# Altium footprint library PBL - SMD Packages.PcbLib: 263 footprints (part 4 of 17)
Each footprint in its own frame and in the unit in brackets; x right, y up, seen from the top. Pads: shape width x height; smd on the part's side, far side on the other; paste and mask are expansions set on the pad; w line width, h text height; cw(c..) or ccw(c..) is an arc to the next point about the centre after c.
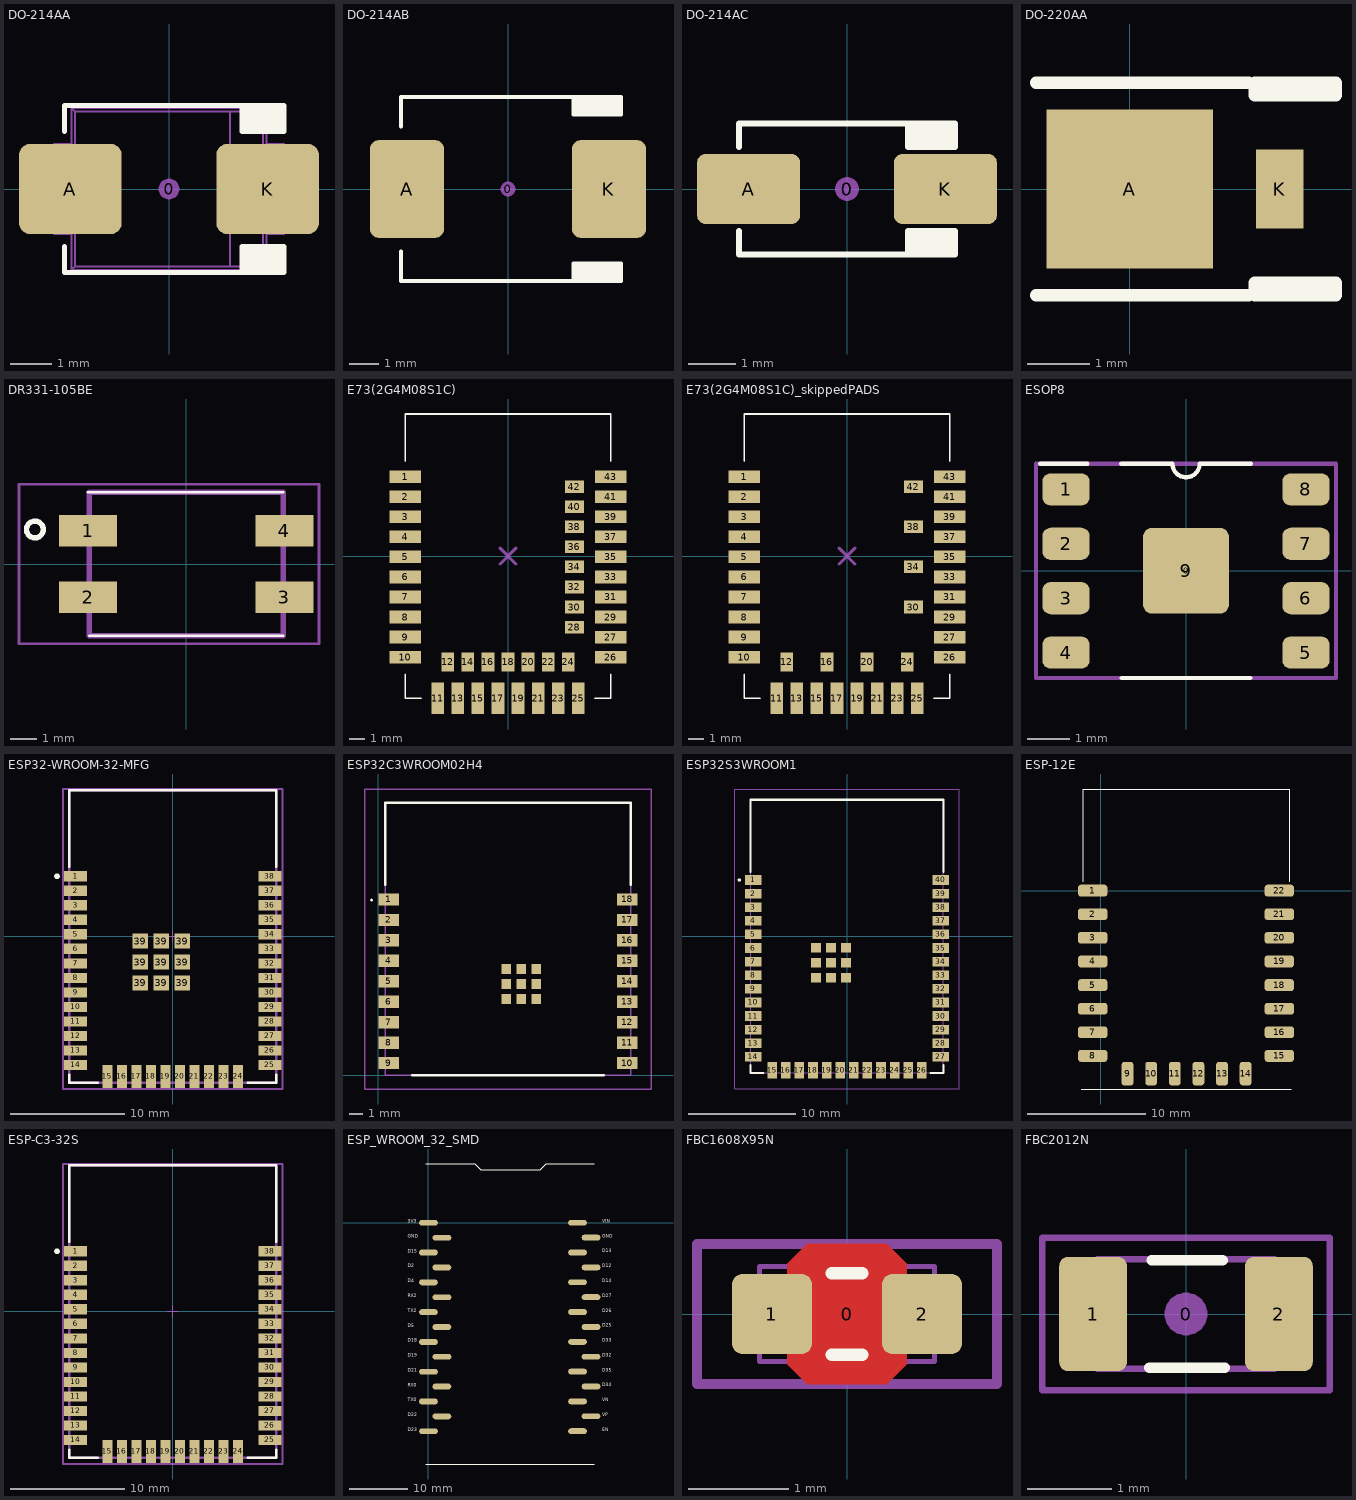
[diagram p3: the footprints below, top view; thin cyan lines are the x and y axes]

## DO-214AA [mm] "JEDEC DO214 variation AA. SMB"
height 2.65
pads (3):
  round 0.508 on Mech15: 0(0,0)
  rrect25% 2.5x2.2 smd: A(-2.4,0) K(2.4,0)
Top Overlay:
  region: 1.778,-1.397 1.778,-2.032 2.794,-2.032 2.794,-1.397
  region: 1.778,1.397 1.778,2.032 2.794,2.032 2.794,1.397
  lines w0.127: -2.54,-1.397 -2.54,-2.032 1.778,-2.032 ; -2.54,1.397 -2.54,2.032 1.778,2.032 ; 1.778,-2.032 2.794,-2.032 2.794,-1.397 1.778,-1.397 1.778,-2.032 ; 1.778,2.032 1.778,1.397 2.794,1.397 2.794,2.032 1.778,2.032
13 - 3D Top Side:
  lines w0.05: -2.375,-1.1 -2.375,-1.973 ; -2.375,1.1 -2.375,1.973 ; 2.375,-1.1 2.375,-1.973 ; 2.375,1.1 2.375,1.973 ; -2.375,-1.973 -2.285,-1.883 ; -2.375,-1.973 -2.373,-1.975 2.373,-1.975 2.375,-1.973 ; -2.375,1.973 -2.285,1.883 ; -2.375,1.973 -2.373,1.975 2.373,1.975 2.375,1.973 ; -2.285,-1.883 -2.285,1.883 ; -2.285,-1.883 1.485,-1.884 ; -2.285,1.883 1.485,1.884 ; 1.485,-1.884 1.485,1.884 ; 1.485,-1.884 2.285,-1.884 ; 1.485,1.884 2.285,1.884 ; 2.285,-1.884 2.375,-1.973 ; 2.285,-1.884 2.285,1.884 ; 2.285,1.884 2.375,1.973 ; -2.8,-1.1 -2.8,1.1 -2.356,1.1 -2.356,-1.1 -2.8,-1.1 ; 2.356,-1.1 2.356,1.1 2.8,1.1 2.8,-1.1 2.356,-1.1
3D body "DO-214AA.STEP": height 2.62, standoff 0, extent -2.8,-1.975 2.8,1.975

## DO-214AB [mm] "JEDEC DO214 variation AB. SMC"
height 2.5
pads (3):
  round 0.508 on Mech15: 0(0,0)
  rrect25% 2.5x3.3 smd: A(-3.4,0) K(3.4,0)
Top Overlay:
  rectangle: 2.2,2.5 3.8,3.1
  rectangle: 2.2,-3.1 3.8,-2.5
  lines w0.127: -3.6,-2.1 -3.6,-3.1 3.8,-3.1 3.8,-2.5 2.2,-2.5 2.2,-3.1 ; -3.6,2.1 -3.6,3.1 3.8,3.1 3.8,2.5 2.2,2.5 2.2,3.1
3D body: height 2.62, standoff 0.01, extent -3.975,-2.975 4.05,2.975

## DO-214AC [mm] "JEDEC DO214 variation AC. SMA"
height 2.5
pads (3):
  round 0.508 on Mech15: 0(0,0)
  rrect25% 2.2x1.5 smd: A(-2.1,0) K(2.1,0)
Top Overlay:
  rectangle: 1.3,-1.4 2.3,-0.9
  rectangle: 1.3,0.9 2.3,1.4
  lines w0.127: -2.3,-0.9 -2.3,-1.4 2.3,-1.4 2.3,-0.9 1.3,-0.9 1.3,-1.4 ; -2.3,0.9 -2.3,1.4 2.3,1.4 2.3,0.9 1.3,0.9 ; 1.3,0.911 1.3,1.4
3D body "SW3dPS-DO-214AC SMA.STEP": height 2.42, standoff 0.02, extent -2.6,-1.3 2.6,1.3

## DO-220AA [mm]
pads (2):
  rect 2.67x2.54 smd mask+0.102: A(0,0)
  rect 0.762x1.27 smd mask+0.102: K(2.4,0)
Top Overlay:
  lines w0.2: -1.5,-1.7 1.9,-1.7 ; -1.5,1.7 1.9,1.7 ; 2,1.5 3.3,1.5 ; 2,1.5 2,1.7 3.3,1.7 3.3,1.5 ; 2,1.5 3.3,1.5 ; 2,-1.7 2,-1.5 3.3,-1.5 3.3,-1.7 3.1,-1.7 2,-1.7
3D body "User Library-DO-220AA.STEP": height 1.15, standoff 0, extent -1.256,-1.17 2.673,1.137

## DR331-105BE [mm] "Footprint for common mode choke DR331-105BE"
pads (4):
  rect 2.2x1.2 smd: 1(-3.7,1.25) 2(-3.7,-1.25) 3(3.7,-1.25) 4(3.7,1.25)
Top Overlay:
  circle w0.2: c-5.7,1.3 r0.316
  lines w0.1: -3.7,2.7 3.65,2.7 -3.7,2.7 ; -3.65,-2.7 3.65,-2.7 -3.65,-2.7
13 - 3D Top Side:
  lines w0.2: -3.65,-2.7 -3.65,2.7 3.65,2.7 3.65,-2.7 -3.65,-2.7
15 - Top Courtyards:
  lines w0.1: -6.3,-3 -6.3,3 5,3 5,-3 -6.3,-3
3D body "DR331-105BE.stp": height 5.4, standoff 0, extent -4.68,-2.7 4.68,2.7

## E73(2G4M08S1C) [mm]
pads (43):
  rect 2x0.8 smd: 1(-6.5,5.03) 2(-6.5,3.76) 3(-6.5,2.49) 4(-6.5,1.22) 5(-6.5,-0.05) 6(-6.5,-1.32) 7(-6.5,-2.59) 8(-6.5,-3.86) 9(-6.5,-5.127) 10(-6.5,-6.4) 26(6.5,-6.4) 27(6.5,-5.13) 29(6.5,-3.86) 31(6.5,-2.59) 33(6.5,-1.32) 35(6.5,-0.05) 37(6.5,1.22) 39(6.5,2.49) 41(6.5,3.757) 43(6.5,5.03)
  rect 0.8x2 smd: 11(-4.445,-9) 13(-3.175,-9) 15(-1.905,-9) 17(-0.635,-9) 19(0.635,-9) 21(1.905,-9) 23(3.175,-9) 25(4.445,-9)
  rect 0.8x1.2 smd: 12(-3.81,-6.7) 14(-2.54,-6.7) 16(-1.27,-6.7) 18(0,-6.7) 20(1.27,-6.7) 22(2.54,-6.7) 24(3.81,-6.7)
  rect 1.2x0.8 smd: 28(4.2,-4.495) 30(4.2,-3.225) 32(4.2,-1.955) 34(4.2,-0.685) 36(4.2,0.585) 38(4.2,1.855) 40(4.2,3.125) 42(4.2,4.39)
Top Overlay:
  lines w0.1: -6.5,-7.5 -6.5,-9 -5.5,-9 ; -6.5,6 -6.5,9 6.5,9 6.5,6 ; 5.5,-9 6.5,-9 6.5,-7.5
Top Component Center:
  lines w0.2: -0.5,-0.5 0.5,0.5 ; -0.5,0.5 0.5,-0.5

## E73(2G4M08S1C)_skippedPADS [mm]
pads (36):
  rect 2x0.8 smd: 1(-6.5,5.03) 2(-6.5,3.76) 3(-6.5,2.49) 4(-6.5,1.22) 5(-6.5,-0.05) 6(-6.5,-1.32) 7(-6.5,-2.59) 8(-6.5,-3.86) 9(-6.5,-5.127) 10(-6.5,-6.4) 26(6.5,-6.4) 27(6.5,-5.13) 29(6.5,-3.86) 31(6.5,-2.59) 33(6.5,-1.32) 35(6.5,-0.05) 37(6.5,1.22) 39(6.5,2.49) 41(6.5,3.757) 43(6.5,5.03)
  rect 0.8x2 smd: 11(-4.445,-9) 13(-3.175,-9) 15(-1.905,-9) 17(-0.635,-9) 19(0.635,-9) 21(1.905,-9) 23(3.175,-9) 25(4.445,-9)
  rect 0.8x1.2 smd: 12(-3.81,-6.7) 16(-1.27,-6.7) 20(1.27,-6.7) 24(3.81,-6.7)
  rect 1.2x0.8 smd: 30(4.2,-3.225) 34(4.2,-0.685) 38(4.2,1.855) 42(4.2,4.39)
Top Overlay:
  lines w0.1: -6.5,-7.5 -6.5,-9 -5.5,-9 ; -6.5,6 -6.5,9 6.5,9 6.5,6 ; 5.5,-9 6.5,-9 6.5,-7.5
Top Component Center:
  lines w0.2: -0.5,-0.5 0.5,0.5 ; -0.5,0.5 0.5,-0.5

## ESOP8 [mm] "SOP8 with exposed pad"
pads (10):
  round 0.254 on Mech15: 0(0,0)
  rrect50% 1.1x0.75 smd: 1(-2.8,1.9) 2(-2.8,0.63) 3(-2.8,-0.64) 4(-2.8,-1.91) 5(2.8,-1.91) 6(2.8,-0.64) 7(2.8,0.63) 8(2.8,1.9)
  rrect20% 2x2 smd mask+0.05: 9(0,0)
Top Overlay:
  lines w0.1: -3.4,2.5 -2.3,2.5 ; -1.514,2.498 -0.316,2.498 ccw(c0.001,2.498) 0.319,2.498 1.516,2.498 ; -1.5,-2.5 1.5,-2.5
Top Courtyard:
  lines w0.1: -3.5,-2.5 3.5,-2.5 3.5,2.5 -3.5,2.5 -3.5,-2.5

## ESP32-WROOM-32-MFG [mm]
pads (47):
  rect 2x0.9 smd paste+0 mask+0: 1(-8.5,5.26) 2(-8.5,3.99) 3(-8.5,2.72) 4(-8.5,1.45) 5(-8.5,0.18) 6(-8.5,-1.09) 7(-8.5,-2.36) 8(-8.5,-3.63) 9(-8.5,-4.9) 10(-8.5,-6.17) 11(-8.5,-7.44) 12(-8.5,-8.71) 13(-8.5,-9.98) 14(-8.5,-11.25) 25(8.5,-11.25) 26(8.5,-9.98) 27(8.5,-8.71) 28(8.5,-7.44) 29(8.5,-6.17) 30(8.5,-4.9) 31(8.5,-3.63) 32(8.5,-2.36) 33(8.5,-1.09) 34(8.5,0.18) 35(8.5,1.45) 36(8.5,2.72) 37(8.5,3.99) 38(8.5,5.26)
  rect 0.9x2 smd paste+0 mask+0: 15(-5.715,-12.25) 16(-4.445,-12.25) 17(-3.175,-12.25) 18(-1.905,-12.25) 19(-0.635,-12.25) 20(0.635,-12.25) 21(1.905,-12.25) 22(3.175,-12.25) 23(4.445,-12.25) 24(5.715,-12.25)
  rect 1.33x1.33 smd paste+0 mask+0: 39(-2.835,-4.075) 39(-2.835,-2.24) 39(-2.835,-0.405) 39(-1,-4.075) 39(-1,-2.24) 39(-1,-0.405) 39(0.835,-4.075) 39(0.835,-2.24) 39(0.835,-0.405)
Top Overlay:
  circle w0.25: c-10.125,5.26 r0.125
  lines w0.2: -9.05,-12.075 -9.05,-12.8 -6.54,-12.8 ; -9.05,6.085 -9.05,12.8 9.05,12.8 9.05,6.085 ; 6.54,-12.8 9.05,-12.8 9.05,-12.075
Top Assembly:
  lines w0.2: -9.6,-13.35 9.6,-13.35 9.6,12.9 -9.6,12.9 -9.6,-13.35
  text ".Designator" at 0,-0.037 h1
Top 3D Body:
  lines w0.2: -9.05,-12.8 9.05,-12.8 9.05,12.8 -9.05,12.8 -9.05,-12.8
Top Courtyard:
  lines w0.2: -9.6,-13.35 9.6,-13.35 9.6,12.9 -9.6,12.9 -9.6,-13.35
Top Component Center:
  lines w0.1: -0.5,0 0.5,0 ; 0,-0.5 0,0.5
3D body "UNK_Espressif_Systems_ESP32-WROOM-32_eec.STEP": height 0.25, standoff 0, extent -9.6,-13.35 9.6,12.9

## ESP32C3WROOM02H4 [mm]
pads (27):
  rect 1.5x0.9 smd: 1(0.75,12.9) 2(0.75,11.4) 3(0.75,9.9) 4(0.75,8.4) 5(0.75,6.9) 6(0.75,5.4) 7(0.75,3.9) 8(0.75,2.4) 9(0.75,0.9) 10(18.25,0.9) 11(18.25,2.4) 12(18.25,3.9) 13(18.25,5.4) 14(18.25,6.9) 15(18.25,8.4) 16(18.25,9.9) 17(18.25,11.4) 18(18.25,12.9)
  rect 0.7x0.7 smd: PAD(9.36,5.6) PAD(9.36,6.7) PAD(9.36,7.8) PAD(10.46,5.6) PAD(10.46,6.7) PAD(10.46,7.8) PAD(11.56,5.6) PAD(11.56,6.7) PAD(11.56,7.8)
Top Overlay:
  lines w0.1: -0.5,12.8 cw(c-0.5,12.85) -0.5,12.9 cw(c-0.5,12.85) -0.5,12.8
  lines w0.2: 0.5,14 0.5,20 18.5,20 18.5,14 ; 2.5,0 16.5,0
13 - 3D Top Side:
  lines w0.1: 0.5,0 0.5,20 18.5,20 18.5,0 0.5,0
15 - Top Courtyards:
  lines w0.1: -1,-1 -1,21 20,21 20,-1 -1,-1
3D body "ESP32-C3-WROOM-02-H4.stp": height 3.45, standoff 0, extent 0.09,0 18.5,20

## ESP32S3WROOM1 [mm]
pads (49):
  rect 1.5x0.9 smd: 1(-8.75,5.26) 2(-8.75,3.99) 3(-8.75,2.72) 4(-8.75,1.45) 5(-8.75,0.18) 6(-8.75,-1.09) 7(-8.75,-2.36) 8(-8.75,-3.63) 9(-8.75,-4.9) 10(-8.75,-6.17) 11(-8.75,-7.44) 12(-8.75,-8.71) 13(-8.75,-9.98) 14(-8.75,-11.25) 27(8.75,-11.25) 28(8.75,-9.98) 29(8.75,-8.71) 30(8.75,-7.44) 31(8.75,-6.17) 32(8.75,-4.9) 33(8.75,-3.63) 34(8.75,-2.36) 35(8.75,-1.09) 36(8.75,0.18) 37(8.75,1.45) 38(8.75,2.72) 39(8.75,3.99) 40(8.75,5.26)
  rect 0.9x1.5 smd: 15(-6.985,-12.5) 16(-5.715,-12.5) 17(-4.445,-12.5) 18(-3.175,-12.5) 19(-1.905,-12.5) 20(-0.635,-12.5) 21(0.635,-12.5) 22(1.905,-12.5) 23(3.175,-12.5) 24(4.445,-12.5) 25(5.715,-12.5) 26(6.985,-12.5)
  rect 0.9x0.9 smd: PAD(-2.9,-3.86) PAD(-2.9,-2.46) PAD(-2.9,-1.06) PAD(-1.5,-3.86) PAD(-1.5,-2.46) PAD(-1.5,-1.06) PAD(-0.1,-3.86) PAD(-0.1,-2.46) PAD(-0.1,-1.06)
Top Overlay:
  lines w0.2: -9,-12 -9,-12.75 -7.8,-12.75 ; -9,6 -9,12.75 9,12.75 9,6 ; 7.8,-12.75 9,-12.75 9,-12 ; -10.1,5.26 ccw(c-10.05,5.26) -10,5.26 ; -10.1,5.26 cw(c-10.05,5.26) -10,5.26 ; -10.1,5.26 ccw(c-10.05,5.26) -10,5.26
13 - 3D Top Side:
  lines w0.1: -9,-12.75 -9,12.75 9,12.75 9,-12.75 -9,-12.75
15 - Top Courtyards:
  lines w0.1: -10.5,-14.25 -10.5,13.75 10.5,13.75 10.5,-14.25 -10.5,-14.25
3D body "UNK_Espressif_Systems_ESP32-WROOM-32_eec.STEP": height 0.25, standoff 0, extent -9.6,-13.35 9.6,12.9

## ESP-12E [mm]
pads (22):
  rrect50% 2.5x1 smd: 1(-0.7,0) 2(-0.7,-2) 3(-0.7,-4) 4(-0.7,-6) 5(-0.7,-8) 6(-0.7,-10) 7(-0.7,-12) 8(-0.7,-14) 15(15.1,-14) 16(15.1,-12) 17(15.1,-10) 18(15.1,-8) 19(15.1,-6) 20(15.1,-4) 21(15.1,-2) 22(15.1,0)
  rrect50% 1x2 smd: 9(2.25,-15.5) 10(4.25,-15.5) 11(6.25,-15.5) 12(8.25,-15.5) 13(10.25,-15.5) 14(12.25,-15.5)
Top Overlay:
  lines w0.1: -1.65,-16.8 16.1,-16.8 ; -1.5,0.75 -1.5,8.6 16,8.6 16,0.75
3D body "User Library-EPS8266 ESP-12E-1.STEP": height 2.65, standoff -0.04, extent -0.855,-15.505 15.155,8.5

## ESP-C3-32S [mm] "ESP-S3-32S footprint for AI-Thinker Module"
pads (38):
  rect 2x0.9 smd paste+0 mask+0: 1(-8.5,5.26) 2(-8.5,3.99) 3(-8.5,2.72) 4(-8.5,1.45) 5(-8.5,0.18) 6(-8.5,-1.09) 7(-8.5,-2.36) 8(-8.5,-3.63) 9(-8.5,-4.9) 10(-8.5,-6.17) 11(-8.5,-7.44) 12(-8.5,-8.71) 13(-8.5,-9.98) 14(-8.5,-11.25) 25(8.5,-11.25) 26(8.5,-9.98) 27(8.5,-8.71) 28(8.5,-7.44) 29(8.5,-6.17) 30(8.5,-4.9) 31(8.5,-3.63) 32(8.5,-2.36) 33(8.5,-1.09) 34(8.5,0.18) 35(8.5,1.45) 36(8.5,2.72) 37(8.5,3.99) 38(8.5,5.26)
  rect 0.9x2 smd paste+0 mask+0: 15(-5.715,-12.25) 16(-4.445,-12.25) 17(-3.175,-12.25) 18(-1.905,-12.25) 19(-0.635,-12.25) 20(0.635,-12.25) 21(1.905,-12.25) 22(3.175,-12.25) 23(4.445,-12.25) 24(5.715,-12.25)
Top Overlay:
  circle w0.25: c-10.125,5.26 r0.125
  lines w0.2: -9.05,-12.075 -9.05,-12.8 -6.54,-12.8 ; -9.05,6.085 -9.05,12.8 9.05,12.8 9.05,6.085 ; 6.54,-12.8 9.05,-12.8 9.05,-12.075
Top Assembly:
  lines w0.2: -9.6,-13.35 9.6,-13.35 9.6,12.9 -9.6,12.9 -9.6,-13.35
  text ".Designator" at 0,-0.037 h1
Top 3D Body:
  lines w0.2: -9.05,-12.8 9.05,-12.8 9.05,12.8 -9.05,12.8 -9.05,-12.8
Top Courtyard:
  lines w0.2: -9.6,-13.35 9.6,-13.35 9.6,12.9 -9.6,12.9 -9.6,-13.35
Top Component Center:
  lines w0.1: -0.5,0 0.5,0 ; 0,-0.5 0,0.5
3D body "UNK_Espressif_Systems_ESP32-WROOM-32_eec.STEP": height 0.25, standoff 0, extent -9.6,-13.35 9.6,12.9

## ESP_WROOM_32_SMD [mm]
pads (30):
  oval 3.2x1 smd: 1(0,0) 2(2.3,-2.54) 3(0,-5.08) 4(2.3,-7.62) 5(0,-10.16) 6(2.3,-12.7) 7(0,-15.24) 8(2.3,-17.78) 9(0,-20.32) 10(2.3,-22.86) 11(0,-25.4) 12(2.3,-27.94) 13(0,-30.48) 14(2.3,-33.02) 15(0,-35.56) 16(25.444,-35.545) 17(27.744,-33.005) 18(25.444,-30.465) 19(27.744,-27.925) 20(25.444,-25.385) 21(27.744,-22.845) 22(25.444,-20.305) 23(27.744,-17.765) 24(25.444,-15.225) 25(27.744,-12.685) 26(25.444,-10.145) 27(27.744,-7.605) 28(25.444,-5.065) 29(27.744,-2.525) 30(25.444,0.015)
Top Overlay:
  lines w0.1: -0.451,-41.148 28.251,-41.148 ; -0.451,10.033 7.931,10.033 8.947,9.017 19.107,9.017 20.123,10.033 28.251,10.033
  text "VIN" at 29.648,-0.239 h1
  text "GND" at 29.648,-2.779 h1
  text "D13" at 29.648,-5.319 h1
  text "D12" at 29.648,-7.859 h1
  text "D14" at 29.648,-10.399 h1
  text "D27" at 29.648,-12.939 h1
  text "D26" at 29.648,-15.479 h1
  text "D25" at 29.648,-18.019 h1
  text "D33" at 29.648,-20.559 h1
  text "D32" at 29.648,-23.099 h1
  text "D35" at 29.648,-25.639 h1
  text "D34" at 29.648,-28.179 h1
  text "VN" at 29.648,-30.719 h1
  text "VP" at 29.648,-33.259 h1
  text "EN" at 29.648,-35.799 h1
  text "D23" at -3.499,-35.814 h1
  text "D22" at -3.499,-33.274 h1
  text "TX0" at -3.499,-30.734 h1
  text "RX0" at -3.499,-28.194 h1
  text "D21" at -3.499,-25.654 h1
  text "D19" at -3.499,-23.114 h1
  text "D18" at -3.499,-20.574 h1
  text "D5" at -3.499,-18.034 h1
  text "TX2" at -3.499,-15.494 h1
  text "RX2" at -3.499,-12.954 h1
  text "D4" at -3.499,-10.414 h1
  text "D2" at -3.499,-7.874 h1
  text "D15" at -3.499,-5.334 h1
  text "GND" at -3.499,-2.794 h1
  text "3V3" at -3.499,-0.254 h1
3D body "esp32_wroom_smd.STEP": height 12.85, standoff 0, extent -0.88,-40.643 28.82,10.287

## FBC1608X95N [mm] "Chip Ferrite, Body 1.6x0.8mm, 0603, IPC Medium Density"
height 0.95
pads (3):
  round 0.254 on Mech15: 0(0,0)
  rrect25% 0.8x0.8 smd: 1(-0.75,0) 2(0.75,0)
Top Layer:
  pour cut-out: -0.6,0.5 -0.4,0.7 0.4,0.7 0.6,0.5 0.6,-0.5 0.4,-0.7 -0.4,-0.7 -0.6,-0.5
Top Overlay:
  lines w0.127: -0.152,-0.406 0.152,-0.406 ; -0.152,0.406 0.152,0.406
13 - 3D Top Side:
  lines w0.05: -0.475,-0.475 -0.475,0.475 ; 0.475,-0.475 0.475,0.475 ; -0.875,-0.475 0.875,-0.475 0.875,0.475 -0.875,0.475 -0.875,-0.475
15 - Top Courtyards:
  lines w0.1: -1.5,-0.7 -1.5,0.7 1.5,0.7 1.5,-0.7 -1.5,-0.7
3D body "FBC1608X95N.STEP": height 0.95, standoff 0, extent -0.875,-0.475 0.875,0.475

## FBC2012N [mm] "Ferrite Bead Chip, Body 2.0x1.2mm, 0805, IPC Medium Density"
height 0.9
pads (3):
  round 0.508 on Mech15: 0(0,0)
  rrect25% 0.8x1.35 smd: 1(-1.1,0) 2(1.1,0)
Top Overlay:
  lines w0.127: -0.432,-0.635 0.457,-0.635 ; -0.406,0.635 0.432,0.635
13 - 3D Top Side:
  lines w0.076: -1.05,-0.65 -1.05,0.65 1.05,0.65 1.05,-0.65 -1.05,-0.65
15 - Top Courtyards:
  lines w0.076: -1.7,-0.9 -1.7,0.9 1.7,0.9 1.7,-0.9 -1.7,-0.9
3D body "FBC_0805.stp": height 0.9, standoff 0, extent -1,-0.625 1,0.625